# Altium footprint library myPCBLib.PcbLib: 113 footprints (part 6 of 8)
Each footprint in its own frame and in the unit in brackets; x right, y up, seen from the top. Pads: shape width x height; smd on the part's side, far side on the other; paste and mask are expansions set on the pad; w line width, h text height; cw(c..) or ccw(c..) is an arc to the next point about the centre after c.
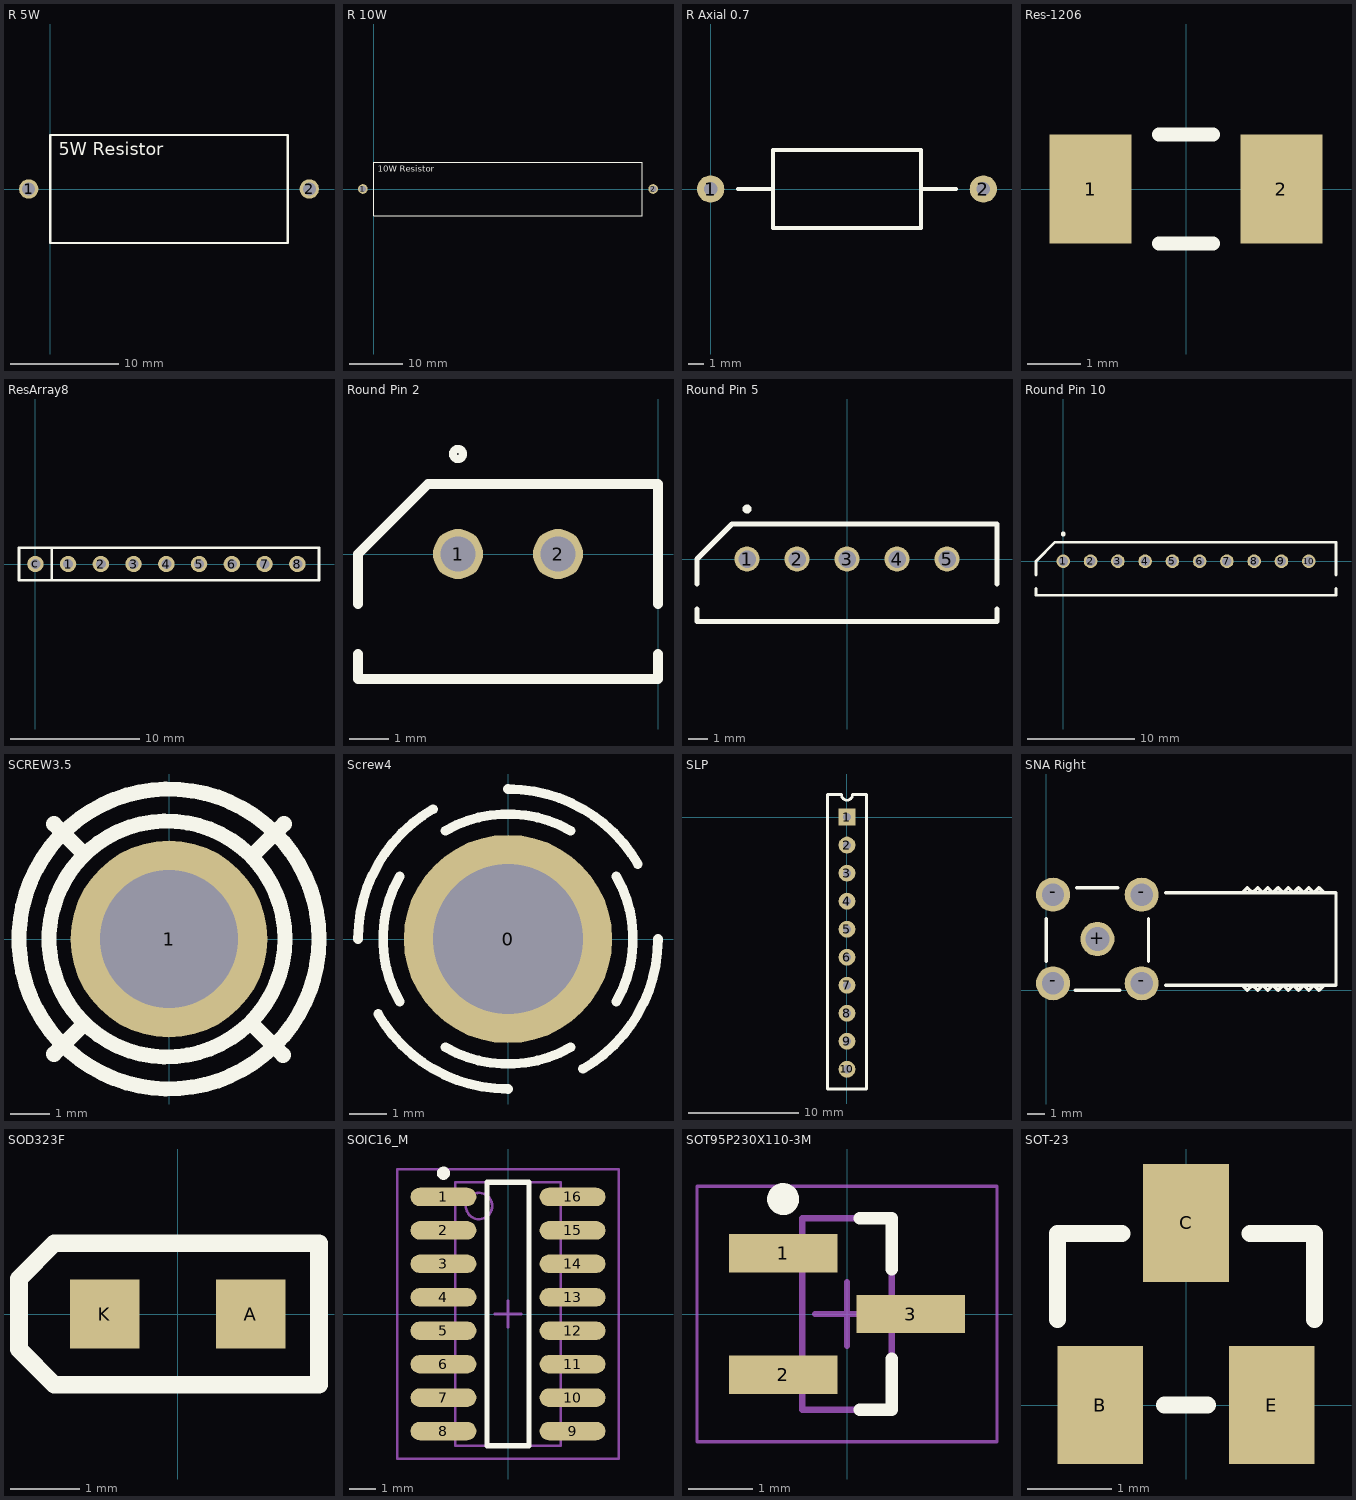
[diagram p5: the footprints below, top view; thin cyan lines are the x and y axes]

## R 5W [mm]
pads (2):
  round 1.8 hole 1.2: 1(-2,0) 2(24,0)
Top Overlay:
  lines w0.203: 0,-5 0,5 22,5 22,-5 0,-5
  text "5W Resistor" at 0.8,2.7 h2

## R 10W [mm]
pads (2):
  round 1.8 hole 1.2: 1(-2,0) 2(52,0)
Top Overlay:
  lines w0.203: 0,-5 50,-5 50,5 0,5 0,-5
  text "10W Resistor" at 0.8,2.7 h2

## R Axial 0.7 [mil]
pads (2):
  round 70 hole 35: 1(0,0) 2(700,0)
Top Overlay:
  lines w10: 70,0 160,0 ; 540,0 630,0 ; 160,0 160,-100 540,-100 540,100 160,100 160,0

## Res-1206 [mil]
pads (2):
  rect 60x80 smd: 1(-70,0) 2(70,0)
Top Overlay:
  lines w10: -20,-40 20,-40 ; -20,40 20,40

## ResArray8 [mil] "8 Resistor Array - 9 pin"
pads (9):
  round 50 hole 30: 1(100,0) 2(200,0) 3(300,0) 4(400,0) 5(500,0) 6(600,0) 7(700,0) 8(800,0) c(0,0)
Top Overlay:
  lines w8: 50,-50 50,50 ; -50,-50 -50,50 866.14,50 866.14,-50 -50,-50

## Round Pin 2 [mil]
pads (2):
  round 50 hole 35: 1(-200,0) 2(-100,0)
Top Overlay:
  circle w8: c-200,100 r5
  lines w10: -300,-100 -300,-125 0,-125 0,-100 ; -300,-50 -300,0 -230,70 0,70 0,-50

## Round Pin 5 [mil]
pads (5):
  round 50 hole 35: 1(-200,0) 2(-100,0) 3(0,0) 4(100,0) 5(200,0)
Top Overlay:
  circle w8: c-200,100 r5
  lines w10: -300,-100 -300,-125 0,-125 265,-125 300,-125 300,-100 ; -300,-50 -300,0 -230,70 300,70 300,-50

## Round Pin 10 [mil]
pads (10):
  round 50 hole 35: 1(0,0) 2(100,0) 3(200,0) 4(300,0) 5(400,0) 6(500,0) 7(600,0) 8(700,0) 9(800,0) 10(900,0)
Top Overlay:
  circle w8: c0,100 r5
  lines w10: -100,-100 -100,-125 200,-125 465,-125 1000,-125 1000,-100 ; -100,-50 -100,0 -30,70 1000,70 1000,-50

## SCREW3.5 [mm]
pads (1):
  round 5 hole 3.5: 1(0,0)
Top Overlay:
  circle w0.381: c-0.051,0 r2.997
  circle w0.381: c0,0 r3.81
  lines w0.4: -2.921,-2.921 -2.159,-2.159 ; -2.921,2.921 -2.159,2.159 ; 2.134,-2.184 2.896,-2.946 ; 2.159,2.159 2.921,2.921

## Screw4 [mm] "Screw Hode 4mm"
pads (1):
  round 5.5 hole 3.962: 0(0,0)
Top Overlay:
  lines w0.254: -3.96,0 cw(c0,0) -1.98,3.429 ; -3.429,-1.98 ccw(c0,0) 0,-3.96 ; -2.86,-1.651 cw(c0,0) -2.86,1.651 ; -1.651,-2.86 ccw(c0,0) 1.651,-2.86 ; -1.651,2.86 cw(c0,0) 1.651,2.86 ; 0,3.96 cw(c0,0) 3.429,1.98 ; 1.98,-3.429 ccw(c0,0) 3.96,0 ; 2.86,-1.651 ccw(c0,0) 2.86,1.651

## SLP [mil] "Single line pakage"
pads (10):
  rect 60x60 hole 30: 1(0,0)
  round 60 hole 30: 2(0,-100) 3(0,-200) 4(0,-300) 5(0,-400) 6(0,-500) 7(0,-600) 8(0,-700) 9(0,-800) 10(0,-900)
Top Overlay:
  lines w10: -70,-970 -70,80 -20,80 ccw(c0,80) 20,80 70,80 70,-970 -70,-970

## SNA Right [mm]
pads (5):
  round 2 hole 1.4: +(3,3)
  round 2 hole 1.3: -(0.4,0.4) -(0.4,5.6) -(5.6,0.4) -(5.6,5.6)
Top Overlay:
  lines w0.203: 0,1.7 0,4.2 ; 1.7,0 4.3,0 ; 1.8,6 4.2,6 ; 6,1.7 6,4.2 ; 7,0.3 17,0.3 17,5.7 7,5.7 ; 11.4,0.3 11.5,0.3 11.8,0 12.1,0.3 12.4,0 12.7,0.3 13,0 13.3,0.3 13.6,0 13.9,0.3 14.2,0 14.5,0.3 14.8,0 15.1,0.3 15.4,0 15.7,0.3 16,0 16.3,0.3 ; 11.5,5.7 11.8,6 12.1,5.7 12.4,6 12.7,5.7 13,6 13.3,5.7 13.6,6 13.9,5.7 14.2,6 14.5,5.7 14.8,6 15.1,5.7 15.4,6 15.7,5.7 16,6 16.3,5.7 16.4,5.7

## SOD323F [mm]
pads (2):
  rect 1x1 smd: A(1.05,0) K(-1.05,0)
Top Overlay:
  lines w0.254: -2.286,-0.508 -1.778,-1.016 2.032,-1.016 2.032,1.016 -1.778,1.016 -2.286,0.508 -2.286,-0.508

## SOIC16_M [mm]
pads (16):
  oval 2.5x0.7 smd: 1(-2.45,4.445) 2(-2.45,3.175) 3(-2.45,1.905) 4(-2.45,0.635) 5(-2.45,-0.635) 6(-2.45,-1.905) 7(-2.45,-3.175) 8(-2.45,-4.445) 9(2.45,-4.445) 10(2.45,-3.175) 11(2.45,-1.905) 12(2.45,-0.635) 13(2.45,0.635) 14(2.45,1.905) 15(2.45,3.175) 16(2.45,4.445)
Top Overlay:
  circle w0.25: c-2.45,5.345 r0.125
  lines w0.2: -0.8,-5 -0.8,5 0.8,5 0.8,-5 -0.8,-5
Mechanical 13:
  circle w0.1: c-1.1,4.1 r0.5
  lines w0.1: -2,-5 -2,5 2,5 2,-5 -2,-5
Mechanical 15:
  lines w0.1: -0.5,0 0.5,0 ; 0,-0.5 0,0.5 ; -4.2,-5.5 -4.2,5.5 4.2,5.5 4.2,-5.5 -4.2,-5.5
3D body: height 1.91, standoff 0, extent -2.032,-5 1.968,5

## SOT95P230X110-3M [mm] "SOT23, 3-Leads, Body 2.90x2.30mm, Pitch 0.95mm, IPC Low Density"
height 1.1
pads (3):
  rect 1.7x0.6 smd: 1(-1,0.95) 2(-1,-0.95) 3(1,0)
Top Overlay:
  circle w0.25: c-1,1.8 r0.125
  lines w0.2: 0.2,-1.5 0.7,-1.5 0.7,-0.7 ; 0.2,1.5 0.7,1.5 0.7,0.7
Mechanical 13:
  lines w0.1: -0.7,-1.5 -0.7,1.5 0.7,1.5 0.7,-1.5 -0.7,-1.5
Mechanical 15:
  lines w0.05: -2.35,-2 -2.35,2 2.35,2 2.35,-2 -2.35,-2
  lines w0.1: -0.5,0 0.5,0 ; 0,-0.5 0,0.5
3D body: height 1.1, standoff 0.05, extent -0.7,-1.5 0.7,1.5

## SOT-23 [mil]
pads (3):
  rect 40x55 smd: B(-40,0) C(0,85) E(40,0)
Top Overlay:
  lines w8: -60,40 -60,80 -30,80 ; -10,0 10,0 ; 30,80 60,80 60,40